# Altium footprint library smd-ipc.PCBLIB: 363 footprints (part 7 of 27)
Each footprint in its own frame and in the unit in brackets; x right, y up, seen from the top. Pads: shape width x height; smd on the part's side, far side on the other; paste and mask are expansions set on the pad; w line width, h text height; cw(c..) or ccw(c..) is an arc to the next point about the centre after c.
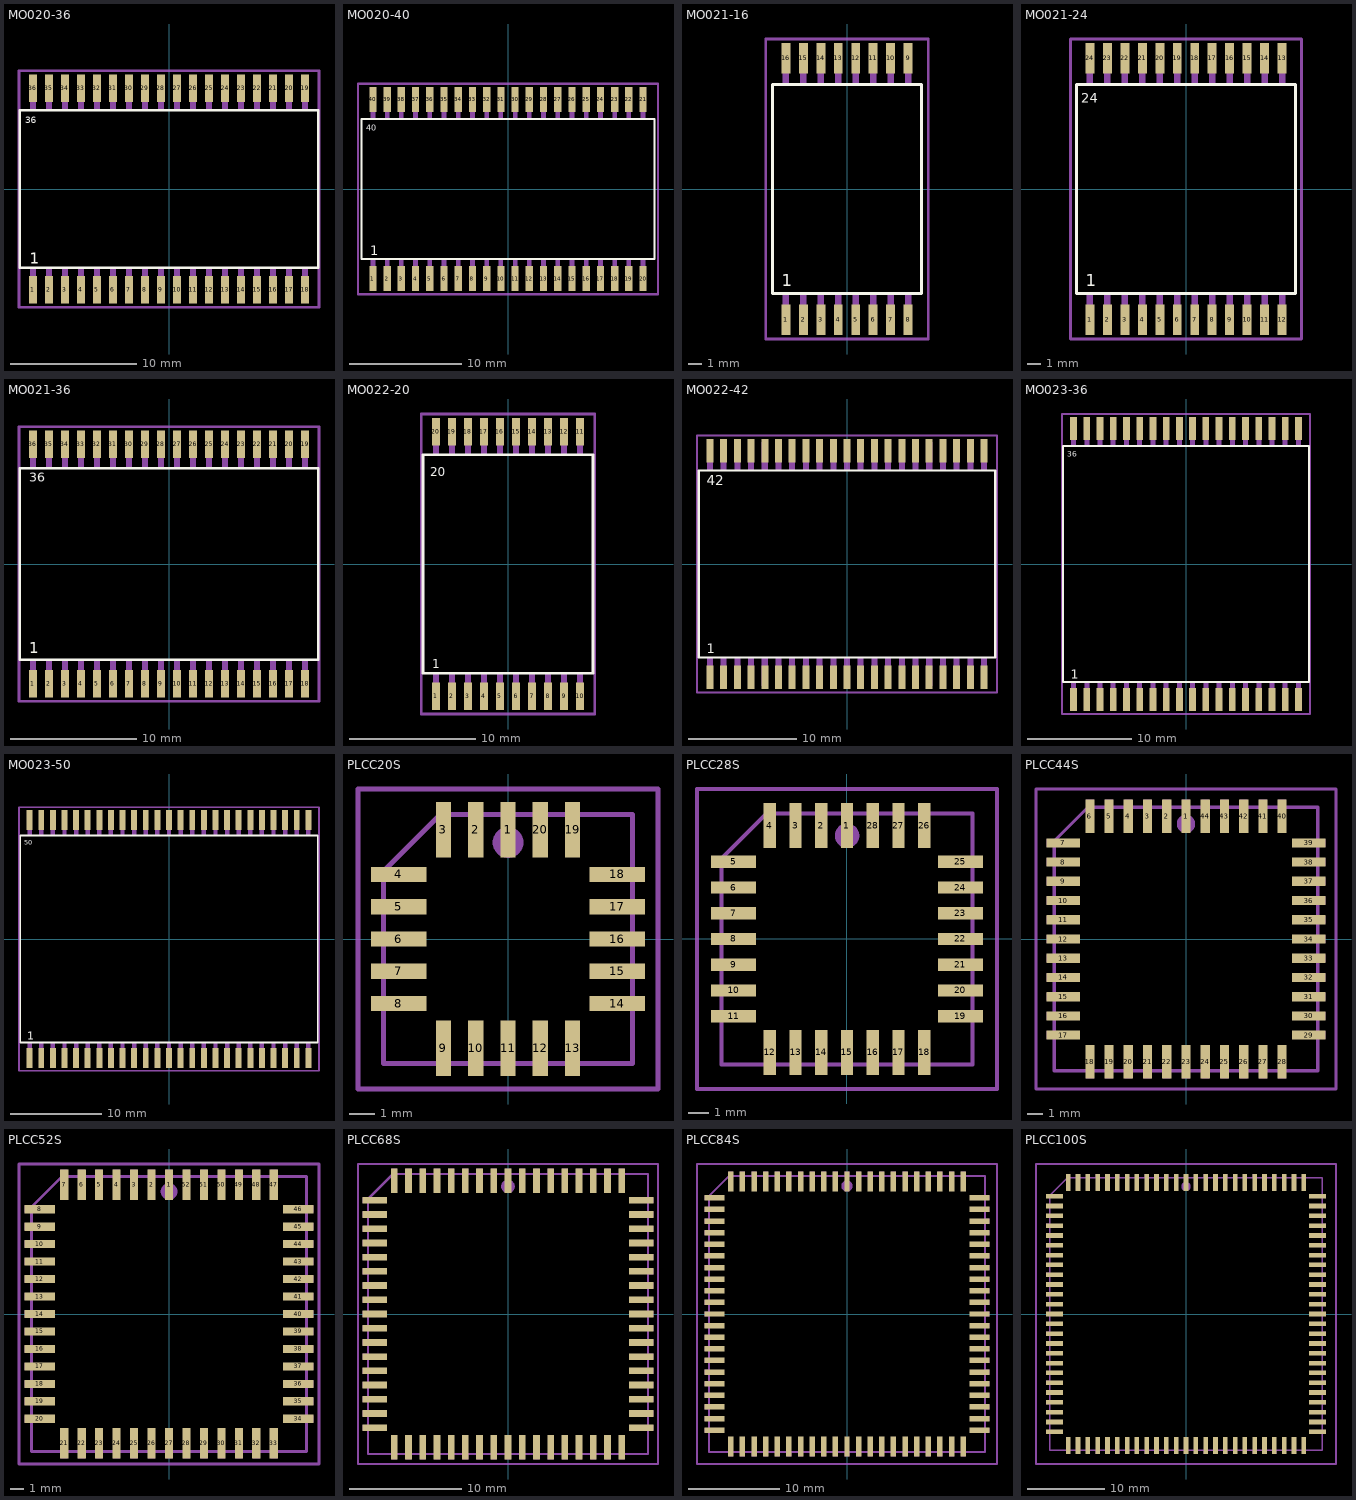
[diagram p6: the footprints below, top view; thin cyan lines are the x and y axes]

## MO020-36 [mm]
pads (36):
  rect 0.65x2.2 smd: 1(-10.795,-8) 2(-9.525,-8) 3(-8.255,-8) 4(-6.985,-8) 5(-5.715,-8) 6(-4.445,-8) 7(-3.175,-8) 8(-1.905,-8) 9(-0.635,-8) 10(0.635,-8) 11(1.905,-8) 12(3.175,-8) 13(4.445,-8) 14(5.715,-8) 15(6.985,-8) 16(8.255,-8) 17(9.525,-8) 18(10.795,-8) 19(10.795,8) 20(9.525,8) 21(8.255,8) 22(6.985,8) 23(5.715,8) 24(4.445,8) 25(3.175,8) 26(1.905,8) 27(0.635,8) 28(-0.635,8) 29(-1.905,8) 30(-3.175,8) 31(-4.445,8) 32(-5.715,8) 33(-6.985,8) 34(-8.255,8) 35(-9.525,8) 36(-10.795,8)
Top Overlay:
  lines w0.203: -11.825,-6.25 11.825,-6.25 11.825,6.25 -11.825,6.25 -11.825,-6.25
  text "1" at -11.046,-5.935 h0.86
  text "36" at -11.386,5.2 h0.52
Mechanical 16:
  rectangle: -11.035,-8.8 -10.555,-6.25
  rectangle: -9.765,-8.8 -9.285,-6.25
  rectangle: -8.495,-8.8 -8.015,-6.25
  rectangle: -7.225,-8.8 -6.745,-6.25
  rectangle: -5.955,-8.8 -5.475,-6.25
  rectangle: -4.685,-8.8 -4.205,-6.25
  rectangle: -3.415,-8.8 -2.935,-6.25
  rectangle: -2.145,-8.8 -1.665,-6.25
  rectangle: -0.875,-8.8 -0.395,-6.25
  rectangle: 0.395,-8.8 0.875,-6.25
  rectangle: 1.665,-8.8 2.145,-6.25
  rectangle: 2.935,-8.8 3.415,-6.25
  rectangle: 4.205,-8.8 4.685,-6.25
  rectangle: 5.475,-8.8 5.955,-6.25
  rectangle: 6.745,-8.8 7.225,-6.25
  rectangle: 8.015,-8.8 8.495,-6.25
  rectangle: 9.285,-8.8 9.765,-6.25
  rectangle: 10.555,-8.8 11.035,-6.25
  rectangle: 10.555,6.25 11.035,8.8
  rectangle: 9.285,6.25 9.765,8.8
  rectangle: 8.015,6.25 8.495,8.8
  rectangle: 6.745,6.25 7.225,8.8
  rectangle: 5.475,6.25 5.955,8.8
  rectangle: 4.205,6.25 4.685,8.8
  rectangle: 2.935,6.25 3.415,8.8
  rectangle: 1.665,6.25 2.145,8.8
  rectangle: 0.395,6.25 0.875,8.8
  rectangle: -0.875,6.25 -0.395,8.8
  rectangle: -2.145,6.25 -1.665,8.8
  rectangle: -3.415,6.25 -2.935,8.8
  rectangle: -4.685,6.25 -4.205,8.8
  rectangle: -5.955,6.25 -5.475,8.8
  rectangle: -7.225,6.25 -6.745,8.8
  rectangle: -8.495,6.25 -8.015,8.8
  rectangle: -9.765,6.25 -9.285,8.8
  rectangle: -11.035,6.25 -10.555,8.8
Mechanical 27:
  lines w0.2: -11.9,-9.4 -11.9,9.4 11.9,9.4 11.9,-9.4 -11.9,-9.4

## MO020-40 [mm]
pads (40):
  rect 0.65x2.2 smd: 1(-12.065,-8) 2(-10.795,-8) 3(-9.525,-8) 4(-8.255,-8) 5(-6.985,-8) 6(-5.715,-8) 7(-4.445,-8) 8(-3.175,-8) 9(-1.905,-8) 10(-0.635,-8) 11(0.635,-8) 12(1.905,-8) 13(3.175,-8) 14(4.445,-8) 15(5.715,-8) 16(6.985,-8) 17(8.255,-8) 18(9.525,-8) 19(10.795,-8) 20(12.065,-8) 21(12.065,8) 22(10.795,8) 23(9.525,8) 24(8.255,8) 25(6.985,8) 26(5.715,8) 27(4.445,8) 28(3.175,8) 29(1.905,8) 30(0.635,8) 31(-0.635,8) 32(-1.905,8) 33(-3.175,8) 34(-4.445,8) 35(-5.715,8) 36(-6.985,8) 37(-8.255,8) 38(-9.525,8) 39(-10.795,8) 40(-12.065,8)
Top Overlay:
  lines w0.203: -13.095,-6.25 13.095,-6.25 13.095,6.25 -13.095,6.25 -13.095,-6.25
  text "1" at -12.316,-5.935 h0.86
  text "40" at -12.656,5.2 h0.52
Mechanical 16:
  rectangle: -12.275,-8.8 -11.855,-6.25
  rectangle: -11.005,-8.8 -10.585,-6.25
  rectangle: -9.735,-8.8 -9.315,-6.25
  rectangle: -8.465,-8.8 -8.045,-6.25
  rectangle: -7.195,-8.8 -6.775,-6.25
  rectangle: -5.925,-8.8 -5.505,-6.25
  rectangle: -4.655,-8.8 -4.235,-6.25
  rectangle: -3.385,-8.8 -2.965,-6.25
  rectangle: -2.115,-8.8 -1.695,-6.25
  rectangle: -0.845,-8.8 -0.425,-6.25
  rectangle: 0.425,-8.8 0.845,-6.25
  rectangle: 1.695,-8.8 2.115,-6.25
  rectangle: 2.965,-8.8 3.385,-6.25
  rectangle: 4.235,-8.8 4.655,-6.25
  rectangle: 5.505,-8.8 5.925,-6.25
  rectangle: 6.775,-8.8 7.195,-6.25
  rectangle: 8.045,-8.8 8.465,-6.25
  rectangle: 9.315,-8.8 9.735,-6.25
  rectangle: 10.585,-8.8 11.005,-6.25
  rectangle: 11.855,-8.8 12.275,-6.25
  rectangle: 11.855,6.25 12.275,8.8
  rectangle: 10.585,6.25 11.005,8.8
  rectangle: 9.315,6.25 9.735,8.8
  rectangle: 8.045,6.25 8.465,8.8
  rectangle: 6.775,6.25 7.195,8.8
  rectangle: 5.505,6.25 5.925,8.8
  rectangle: 4.235,6.25 4.655,8.8
  rectangle: 2.965,6.25 3.385,8.8
  rectangle: 1.695,6.25 2.115,8.8
  rectangle: 0.425,6.25 0.845,8.8
  rectangle: -0.845,6.25 -0.425,8.8
  rectangle: -2.115,6.25 -1.695,8.8
  rectangle: -3.385,6.25 -2.965,8.8
  rectangle: -4.655,6.25 -4.235,8.8
  rectangle: -5.925,6.25 -5.505,8.8
  rectangle: -7.195,6.25 -6.775,8.8
  rectangle: -8.465,6.25 -8.045,8.8
  rectangle: -9.735,6.25 -9.315,8.8
  rectangle: -11.005,6.25 -10.585,8.8
  rectangle: -12.275,6.25 -11.855,8.8
Mechanical 27:
  lines w0.2: -13.4,-9.4 -13.4,9.4 13.4,9.4 13.4,-9.4 -13.4,-9.4

## MO021-16 [mm]
pads (16):
  rect 0.65x2.2 smd: 1(-4.445,-9.5) 2(-3.175,-9.5) 3(-1.905,-9.5) 4(-0.635,-9.5) 5(0.635,-9.5) 6(1.905,-9.5) 7(3.175,-9.5) 8(4.445,-9.5) 9(4.445,9.5) 10(3.175,9.5) 11(1.905,9.5) 12(0.635,9.5) 13(-0.635,9.5) 14(-1.905,9.5) 15(-3.175,9.5) 16(-4.445,9.5)
Top Overlay:
  lines w0.203: -5.41,-7.585 5.41,-7.585 5.41,7.585 -5.41,7.585 -5.41,-7.585
  text "1" at -4.756,-7.07 h0.86
Mechanical 16:
  rectangle: -4.685,-10.3 -4.205,-7.6
  rectangle: -3.415,-10.3 -2.935,-7.6
  rectangle: -2.145,-10.3 -1.665,-7.6
  rectangle: -0.875,-10.3 -0.395,-7.6
  rectangle: 0.395,-10.3 0.875,-7.6
  rectangle: 1.665,-10.3 2.145,-7.6
  rectangle: 2.935,-10.3 3.415,-7.6
  rectangle: 4.205,-10.3 4.685,-7.6
  rectangle: 4.205,7.6 4.685,10.3
  rectangle: 2.935,7.6 3.415,10.3
  rectangle: 1.665,7.6 2.145,10.3
  rectangle: 0.395,7.6 0.875,10.3
  rectangle: -0.875,7.6 -0.395,10.3
  rectangle: -2.145,7.6 -1.665,10.3
  rectangle: -3.415,7.6 -2.935,10.3
  rectangle: -4.685,7.6 -4.205,10.3
Mechanical 27:
  lines w0.2: -5.9,-10.9 -5.9,10.9 5.9,10.9 5.9,-10.9 -5.9,-10.9

## MO021-24 [mm]
pads (24):
  rect 0.65x2.2 smd: 1(-6.985,-9.5) 2(-5.715,-9.5) 3(-4.445,-9.5) 4(-3.175,-9.5) 5(-1.905,-9.5) 6(-0.635,-9.5) 7(0.635,-9.5) 8(1.905,-9.5) 9(3.175,-9.5) 10(4.445,-9.5) 11(5.715,-9.5) 12(6.985,-9.5) 13(6.985,9.5) 14(5.715,9.5) 15(4.445,9.5) 16(3.175,9.5) 17(1.905,9.5) 18(0.635,9.5) 19(-0.635,9.5) 20(-1.905,9.5) 21(-3.175,9.5) 22(-4.445,9.5) 23(-5.715,9.5) 24(-6.985,9.5)
Top Overlay:
  lines w0.203: -7.95,-7.585 7.95,-7.585 7.95,7.585 -7.95,7.585 -7.95,-7.585
  text "1" at -7.296,-7.07 h0.86
  text "24" at -7.606,6.265 h0.69
Mechanical 16:
  rectangle: -7.225,-10.3 -6.745,-7.6
  rectangle: -5.955,-10.3 -5.475,-7.6
  rectangle: -4.685,-10.3 -4.205,-7.6
  rectangle: -3.415,-10.3 -2.935,-7.6
  rectangle: -2.145,-10.3 -1.665,-7.6
  rectangle: -0.875,-10.3 -0.395,-7.6
  rectangle: 0.395,-10.3 0.875,-7.6
  rectangle: 1.665,-10.3 2.145,-7.6
  rectangle: 2.935,-10.3 3.415,-7.6
  rectangle: 4.205,-10.3 4.685,-7.6
  rectangle: 5.475,-10.3 5.955,-7.6
  rectangle: 6.745,-10.3 7.225,-7.6
  rectangle: 6.745,7.6 7.225,10.3
  rectangle: 5.475,7.6 5.955,10.3
  rectangle: 4.205,7.6 4.685,10.3
  rectangle: 2.935,7.6 3.415,10.3
  rectangle: 1.665,7.6 2.145,10.3
  rectangle: 0.395,7.6 0.875,10.3
  rectangle: -0.875,7.6 -0.395,10.3
  rectangle: -2.145,7.6 -1.665,10.3
  rectangle: -3.415,7.6 -2.935,10.3
  rectangle: -4.685,7.6 -4.205,10.3
  rectangle: -5.955,7.6 -5.475,10.3
  rectangle: -7.225,7.6 -6.745,10.3
Mechanical 27:
  lines w0.2: -8.4,-10.9 -8.4,10.9 8.4,10.9 8.4,-10.9 -8.4,-10.9

## MO021-36 [mm]
pads (36):
  rect 0.65x2.2 smd: 1(-10.795,-9.5) 2(-9.525,-9.5) 3(-8.255,-9.5) 4(-6.985,-9.5) 5(-5.715,-9.5) 6(-4.445,-9.5) 7(-3.175,-9.5) 8(-1.905,-9.5) 9(-0.635,-9.5) 10(0.635,-9.5) 11(1.905,-9.5) 12(3.175,-9.5) 13(4.445,-9.5) 14(5.715,-9.5) 15(6.985,-9.5) 16(8.255,-9.5) 17(9.525,-9.5) 18(10.795,-9.5) 19(10.795,9.5) 20(9.525,9.5) 21(8.255,9.5) 22(6.985,9.5) 23(5.715,9.5) 24(4.445,9.5) 25(3.175,9.5) 26(1.905,9.5) 27(0.635,9.5) 28(-0.635,9.5) 29(-1.905,9.5) 30(-3.175,9.5) 31(-4.445,9.5) 32(-5.715,9.5) 33(-6.985,9.5) 34(-8.255,9.5) 35(-9.525,9.5) 36(-10.795,9.5)
Top Overlay:
  lines w0.203: -11.833,-7.585 11.833,-7.585 11.833,7.585 -11.833,7.585 -11.833,-7.585
  text "1" at -11.106,-7.07 h0.86
  text "36" at -11.106,6.265 h1.26
Mechanical 16:
  rectangle: -11.035,-10.3 -10.555,-7.6
  rectangle: -9.765,-10.3 -9.285,-7.6
  rectangle: -8.495,-10.3 -8.015,-7.6
  rectangle: -7.225,-10.3 -6.745,-7.6
  rectangle: -5.955,-10.3 -5.475,-7.6
  rectangle: -4.685,-10.3 -4.205,-7.6
  rectangle: -3.415,-10.3 -2.935,-7.6
  rectangle: -2.145,-10.3 -1.665,-7.6
  rectangle: -0.875,-10.3 -0.395,-7.6
  rectangle: 0.395,-10.3 0.875,-7.6
  rectangle: 1.665,-10.3 2.145,-7.6
  rectangle: 2.935,-10.3 3.415,-7.6
  rectangle: 4.205,-10.3 4.685,-7.6
  rectangle: 5.475,-10.3 5.955,-7.6
  rectangle: 6.745,-10.3 7.225,-7.6
  rectangle: 8.015,-10.3 8.495,-7.6
  rectangle: 9.285,-10.3 9.765,-7.6
  rectangle: 10.555,-10.3 11.035,-7.6
  rectangle: 10.555,7.6 11.035,10.3
  rectangle: 9.285,7.6 9.765,10.3
  rectangle: 8.015,7.6 8.495,10.3
  rectangle: 6.745,7.6 7.225,10.3
  rectangle: 5.475,7.6 5.955,10.3
  rectangle: 4.205,7.6 4.685,10.3
  rectangle: 2.935,7.6 3.415,10.3
  rectangle: 1.665,7.6 2.145,10.3
  rectangle: 0.395,7.6 0.875,10.3
  rectangle: -0.875,7.6 -0.395,10.3
  rectangle: -2.145,7.6 -1.665,10.3
  rectangle: -3.415,7.6 -2.935,10.3
  rectangle: -4.685,7.6 -4.205,10.3
  rectangle: -5.955,7.6 -5.475,10.3
  rectangle: -7.225,7.6 -6.745,10.3
  rectangle: -8.495,7.6 -8.015,10.3
  rectangle: -9.765,7.6 -9.285,10.3
  rectangle: -11.035,7.6 -10.555,10.3
Mechanical 27:
  lines w0.2: -11.9,-10.9 -11.9,10.9 11.9,10.9 11.9,-10.9 -11.9,-10.9

## MO022-20 [mm]
pads (20):
  rect 0.65x2.2 smd: 1(-5.715,-10.5) 2(-4.445,-10.5) 3(-3.175,-10.5) 4(-1.905,-10.5) 5(-0.635,-10.5) 6(0.635,-10.5) 7(1.905,-10.5) 8(3.175,-10.5) 9(4.445,-10.5) 10(5.715,-10.5) 11(5.715,10.5) 12(4.445,10.5) 13(3.175,10.5) 14(1.905,10.5) 15(0.635,10.5) 16(-0.635,10.5) 17(-1.905,10.5) 18(-3.175,10.5) 19(-4.445,10.5) 20(-5.715,10.5)
Top Overlay:
  lines w0.203: -6.745,-8.655 6.745,-8.655 6.745,8.655 -6.745,8.655 -6.745,-8.655
  text "1" at -6.026,-8.285 h0.69
  text "20" at -6.161,6.955 h0.69
Mechanical 16:
  rectangle: -5.955,-11.3 -5.475,-8.6
  rectangle: -4.685,-11.3 -4.205,-8.6
  rectangle: -3.415,-11.3 -2.935,-8.6
  rectangle: -2.145,-11.3 -1.665,-8.6
  rectangle: -0.875,-11.3 -0.395,-8.6
  rectangle: 0.395,-11.3 0.875,-8.6
  rectangle: 1.665,-11.3 2.145,-8.6
  rectangle: 2.935,-11.3 3.415,-8.6
  rectangle: 4.205,-11.3 4.685,-8.6
  rectangle: 5.475,-11.3 5.955,-8.6
  rectangle: 5.475,8.6 5.955,11.3
  rectangle: 4.205,8.6 4.685,11.3
  rectangle: 2.935,8.6 3.415,11.3
  rectangle: 1.665,8.6 2.145,11.3
  rectangle: 0.395,8.6 0.875,11.3
  rectangle: -0.875,8.6 -0.395,11.3
  rectangle: -2.145,8.6 -1.665,11.3
  rectangle: -3.415,8.6 -2.935,11.3
  rectangle: -4.685,8.6 -4.205,11.3
  rectangle: -5.955,8.6 -5.475,11.3
Mechanical 27:
  lines w0.2: -6.9,-11.9 -6.9,11.9 6.9,11.9 6.9,-11.9 -6.9,-11.9

## MO022-42 [mm]
pads (42):
  rect 0.65x2.2 smd: 1(-12.7,-10.5) 2(-11.43,-10.5) 3(-10.16,-10.5) 4(-8.89,-10.5) 5(-7.62,-10.5) 6(-6.35,-10.5) 7(-5.08,-10.5) 8(-3.81,-10.5) 9(-2.54,-10.5) 10(-1.27,-10.5) 11(0,-10.5) 12(1.27,-10.5) 13(2.54,-10.5) 14(3.81,-10.5) 15(5.08,-10.5) 16(6.35,-10.5) 17(7.62,-10.5) 18(8.89,-10.5) 19(10.16,-10.5) 20(11.43,-10.5) 21(12.7,-10.5) 22(12.7,10.5) 23(11.43,10.5) 24(10.16,10.5) 25(8.89,10.5) 26(7.62,10.5) 27(6.35,10.5) 28(5.08,10.5) 29(3.81,10.5) 30(2.54,10.5) 31(1.27,10.5) 32(0,10.5) 33(-1.27,10.5) 34(-2.54,10.5) 35(-3.81,10.5) 36(-5.08,10.5) 37(-6.35,10.5) 38(-7.62,10.5) 39(-8.89,10.5) 40(-10.16,10.5) 41(-11.43,10.5) 42(-12.7,10.5)
Top Overlay:
  lines w0.203: -13.73,-8.655 13.73,-8.655 13.73,8.655 -13.73,8.655 -13.73,-8.655
  text "1" at -13.011,-8.285 h0.86
  text "42" at -13.011,6.955 h1.57
Mechanical 16:
  rectangle: -12.98,-11.3 -12.42,-8.6
  rectangle: -11.71,-11.3 -11.15,-8.6
  rectangle: -10.44,-11.3 -9.88,-8.6
  rectangle: -9.17,-11.3 -8.61,-8.6
  rectangle: -7.9,-11.3 -7.34,-8.6
  rectangle: -6.63,-11.3 -6.07,-8.6
  rectangle: -5.36,-11.3 -4.8,-8.6
  rectangle: -4.09,-11.3 -3.53,-8.6
  rectangle: -2.82,-11.3 -2.26,-8.6
  rectangle: -1.55,-11.3 -0.99,-8.6
  rectangle: -0.28,-11.3 0.28,-8.6
  rectangle: 0.99,-11.3 1.55,-8.6
  rectangle: 2.26,-11.3 2.82,-8.6
  rectangle: 3.53,-11.3 4.09,-8.6
  rectangle: 4.8,-11.3 5.36,-8.6
  rectangle: 6.07,-11.3 6.63,-8.6
  rectangle: 7.34,-11.3 7.9,-8.6
  rectangle: 8.61,-11.3 9.17,-8.6
  rectangle: 9.88,-11.3 10.44,-8.6
  rectangle: 11.15,-11.3 11.71,-8.6
  rectangle: 12.42,-11.3 12.98,-8.6
  rectangle: 12.42,8.6 12.98,11.3
  rectangle: 11.15,8.6 11.71,11.3
  rectangle: 9.88,8.6 10.44,11.3
  rectangle: 8.61,8.6 9.17,11.3
  rectangle: 7.34,8.6 7.9,11.3
  rectangle: 6.07,8.6 6.63,11.3
  rectangle: 4.8,8.6 5.36,11.3
  rectangle: 3.53,8.6 4.09,11.3
  rectangle: 2.26,8.6 2.82,11.3
  rectangle: 0.99,8.6 1.55,11.3
  rectangle: -0.28,8.6 0.28,11.3
  rectangle: -1.55,8.6 -0.99,11.3
  rectangle: -2.82,8.6 -2.26,11.3
  rectangle: -4.09,8.6 -3.53,11.3
  rectangle: -5.36,8.6 -4.8,11.3
  rectangle: -6.63,8.6 -6.07,11.3
  rectangle: -7.9,8.6 -7.34,11.3
  rectangle: -9.17,8.6 -8.61,11.3
  rectangle: -10.44,8.6 -9.88,11.3
  rectangle: -11.71,8.6 -11.15,11.3
  rectangle: -12.98,8.6 -12.42,11.3
Mechanical 27:
  lines w0.2: -13.9,-11.9 -13.9,11.9 13.9,11.9 13.9,-11.9 -13.9,-11.9

## MO023-36 [mm]
pads (36):
  rect 0.65x2.2 smd: 1(-10.795,-13) 2(-9.525,-13) 3(-8.255,-13) 4(-6.985,-13) 5(-5.715,-13) 6(-4.445,-13) 7(-3.175,-13) 8(-1.905,-13) 9(-0.635,-13) 10(0.635,-13) 11(1.905,-13) 12(3.175,-13) 13(4.445,-13) 14(5.715,-13) 15(6.985,-13) 16(8.255,-13) 17(9.525,-13) 18(10.795,-13) 19(10.795,13) 20(9.525,13) 21(8.255,13) 22(6.985,13) 23(5.715,13) 24(4.445,13) 25(3.175,13) 26(1.905,13) 27(0.635,13) 28(-0.635,13) 29(-1.905,13) 30(-3.175,13) 31(-4.445,13) 32(-5.715,13) 33(-6.985,13) 34(-8.255,13) 35(-9.525,13) 36(-10.795,13)
Top Overlay:
  lines w0.203: -11.825,-11.33 11.825,-11.33 11.825,11.33 -11.825,11.33 -11.825,-11.33
  text "1" at -11.046,-11.015 h0.86
  text "36" at -11.386,10.28 h0.52
Mechanical 16:
  rectangle: -11.035,-13.8 -10.555,-11.25
  rectangle: -9.765,-13.8 -9.285,-11.25
  rectangle: -8.495,-13.8 -8.015,-11.25
  rectangle: -7.225,-13.8 -6.745,-11.25
  rectangle: -5.955,-13.8 -5.475,-11.25
  rectangle: -4.685,-13.8 -4.205,-11.25
  rectangle: -3.415,-13.8 -2.935,-11.25
  rectangle: -2.145,-13.8 -1.665,-11.25
  rectangle: -0.875,-13.8 -0.395,-11.25
  rectangle: 0.395,-13.8 0.875,-11.25
  rectangle: 1.665,-13.8 2.145,-11.25
  rectangle: 2.935,-13.8 3.415,-11.25
  rectangle: 4.205,-13.8 4.685,-11.25
  rectangle: 5.475,-13.8 5.955,-11.25
  rectangle: 6.745,-13.8 7.225,-11.25
  rectangle: 8.015,-13.8 8.495,-11.25
  rectangle: 9.285,-13.8 9.765,-11.25
  rectangle: 10.555,-13.8 11.035,-11.25
  rectangle: 10.555,11.25 11.035,13.8
  rectangle: 9.285,11.25 9.765,13.8
  rectangle: 8.015,11.25 8.495,13.8
  rectangle: 6.745,11.25 7.225,13.8
  rectangle: 5.475,11.25 5.955,13.8
  rectangle: 4.205,11.25 4.685,13.8
  rectangle: 2.935,11.25 3.415,13.8
  rectangle: 1.665,11.25 2.145,13.8
  rectangle: 0.395,11.25 0.875,13.8
  rectangle: -0.875,11.25 -0.395,13.8
  rectangle: -2.145,11.25 -1.665,13.8
  rectangle: -3.415,11.25 -2.935,13.8
  rectangle: -4.685,11.25 -4.205,13.8
  rectangle: -5.955,11.25 -5.475,13.8
  rectangle: -7.225,11.25 -6.745,13.8
  rectangle: -8.495,11.25 -8.015,13.8
  rectangle: -9.765,11.25 -9.285,13.8
  rectangle: -11.035,11.25 -10.555,13.8
Mechanical 27:
  lines w0.2: -11.9,-14.4 -11.9,14.4 11.9,14.4 11.9,-14.4 -11.9,-14.4

## MO023-50 [mm]
pads (50):
  rect 0.65x2.2 smd: 1(-15.24,-13) 2(-13.97,-13) 3(-12.7,-13) 4(-11.43,-13) 5(-10.16,-13) 6(-8.89,-13) 7(-7.62,-13) 8(-6.35,-13) 9(-5.08,-13) 10(-3.81,-13) 11(-2.54,-13) 12(-1.27,-13) 13(0,-13) 14(1.27,-13) 15(2.54,-13) 16(3.81,-13) 17(5.08,-13) 18(6.35,-13) 19(7.62,-13) 20(8.89,-13) 21(10.16,-13) 22(11.43,-13) 23(12.7,-13) 24(13.97,-13) 25(15.24,-13) 26(15.24,13) 27(13.97,13) 28(12.7,13) 29(11.43,13) 30(10.16,13) 31(8.89,13) 32(7.62,13) 33(6.35,13) 34(5.08,13) 35(3.81,13) 36(2.54,13) 37(1.27,13) 38(0,13) 39(-1.27,13) 40(-2.54,13) 41(-3.81,13) 42(-5.08,13) 43(-6.35,13) 44(-7.62,13) 45(-8.89,13) 46(-10.16,13) 47(-11.43,13) 48(-12.7,13) 49(-13.97,13) 50(-15.24,13)
Top Overlay:
  lines w0.203: -16.27,-11.33 16.27,-11.33 16.27,11.33 -16.27,11.33 -16.27,-11.33
  text "1" at -15.491,-11.015 h0.86
  text "50" at -15.831,10.28 h0.52
Mechanical 16:
  rectangle: -15.48,-13.8 -15,-11.25
  rectangle: -14.21,-13.8 -13.73,-11.25
  rectangle: -12.94,-13.8 -12.46,-11.25
  rectangle: -11.67,-13.8 -11.19,-11.25
  rectangle: -10.4,-13.8 -9.92,-11.25
  rectangle: -9.13,-13.8 -8.65,-11.25
  rectangle: -7.86,-13.8 -7.38,-11.25
  rectangle: -6.59,-13.8 -6.11,-11.25
  rectangle: -5.32,-13.8 -4.84,-11.25
  rectangle: -4.05,-13.8 -3.57,-11.25
  rectangle: -2.78,-13.8 -2.3,-11.25
  rectangle: -1.51,-13.8 -1.03,-11.25
  rectangle: -0.24,-13.8 0.24,-11.25
  rectangle: 1.03,-13.8 1.51,-11.25
  rectangle: 2.3,-13.8 2.78,-11.25
  rectangle: 3.57,-13.8 4.05,-11.25
  rectangle: 4.84,-13.8 5.32,-11.25
  rectangle: 6.11,-13.8 6.59,-11.25
  rectangle: 7.38,-13.8 7.86,-11.25
  rectangle: 8.65,-13.8 9.13,-11.25
  rectangle: 9.92,-13.8 10.4,-11.25
  rectangle: 11.19,-13.8 11.67,-11.25
  rectangle: 12.46,-13.8 12.94,-11.25
  rectangle: 13.73,-13.8 14.21,-11.25
  rectangle: 15,-13.8 15.48,-11.25
  rectangle: 15,11.25 15.48,13.8
  rectangle: 13.73,11.25 14.21,13.8
  rectangle: 12.46,11.25 12.94,13.8
  rectangle: 11.19,11.25 11.67,13.8
  rectangle: 9.92,11.25 10.4,13.8
  rectangle: 8.65,11.25 9.13,13.8
  rectangle: 7.38,11.25 7.86,13.8
  rectangle: 6.11,11.25 6.59,13.8
  rectangle: 4.84,11.25 5.32,13.8
  rectangle: 3.57,11.25 4.05,13.8
  rectangle: 2.3,11.25 2.78,13.8
  rectangle: 1.03,11.25 1.51,13.8
  rectangle: -0.24,11.25 0.24,13.8
  rectangle: -1.51,11.25 -1.03,13.8
  rectangle: -2.78,11.25 -2.3,13.8
  rectangle: -4.05,11.25 -3.57,13.8
  rectangle: -5.32,11.25 -4.84,13.8
  rectangle: -6.59,11.25 -6.11,13.8
  rectangle: -7.86,11.25 -7.38,13.8
  rectangle: -9.13,11.25 -8.65,13.8
  rectangle: -10.4,11.25 -9.92,13.8
  rectangle: -11.67,11.25 -11.19,13.8
  rectangle: -12.94,11.25 -12.46,13.8
  rectangle: -14.21,11.25 -13.73,13.8
  rectangle: -15.48,11.25 -15,13.8
Mechanical 27:
  lines w0.2: -16.4,-14.4 -16.4,14.4 16.4,14.4 16.4,-14.4 -16.4,-14.4

## PLCC20S [mm]
pads (20):
  rect 0.6x2.2 smd: 1(0,4.3) 2(-1.27,4.3) 3(-2.54,4.3) 9(-2.54,-4.3) 10(-1.27,-4.3) 11(0,-4.3) 12(1.27,-4.3) 13(2.54,-4.3) 19(2.54,4.3) 20(1.27,4.3)
  rect 2.2x0.6 smd: 4(-4.3,2.54) 5(-4.3,1.27) 6(-4.3,0) 7(-4.3,-1.27) 8(-4.3,-2.54) 14(4.3,-2.54) 15(4.3,-1.27) 16(4.3,0) 17(4.3,1.27) 18(4.3,2.54)
Mechanical 16:
  circle w0.61: c0,3.8 r0.3
  rectangle: -0.26,4.95 0.26,5.4
  rectangle: -1.53,4.95 -1.01,5.4
  rectangle: -2.8,4.95 -2.28,5.4
  rectangle: -5.4,2.28 -4.95,2.8
  rectangle: -5.4,1.01 -4.95,1.53
  rectangle: -5.4,-0.26 -4.95,0.26
  rectangle: -5.4,-1.53 -4.95,-1.01
  rectangle: -5.4,-2.8 -4.95,-2.28
  rectangle: -2.8,-5.4 -2.28,-4.95
  rectangle: -1.53,-5.4 -1.01,-4.95
  rectangle: -0.26,-5.4 0.26,-4.95
  rectangle: 1.01,-5.4 1.53,-4.95
  rectangle: 2.28,-5.4 2.8,-4.95
  rectangle: 4.95,-2.8 5.4,-2.28
  rectangle: 4.95,-1.53 5.4,-1.01
  rectangle: 4.95,-0.26 5.4,0.26
  rectangle: 4.95,1.01 5.4,1.53
  rectangle: 4.95,2.28 5.4,2.8
  rectangle: 2.28,4.95 2.8,5.4
  rectangle: 1.01,4.95 1.53,5.4
  lines w0.203: -4.9,-4.9 -4.9,2.665 -2.665,4.9 4.9,4.9 4.9,-4.9 -4.9,-4.9
Mechanical 27:
  lines w0.2: -5.903,-5.903 5.903,-5.903 5.903,5.903 -5.903,5.903 -5.903,-5.903

## PLCC28S [mm]
pads (28):
  rect 0.6x2.2 smd: 1(0,5.6) 2(-1.27,5.6) 3(-2.54,5.6) 4(-3.81,5.6) 12(-3.81,-5.6) 13(-2.54,-5.6) 14(-1.27,-5.6) 15(0,-5.6) 16(1.27,-5.6) 17(2.54,-5.6) 18(3.81,-5.6) 26(3.81,5.6) 27(2.54,5.6) 28(1.27,5.6)
  rect 2.2x0.6 smd: 5(-5.6,3.81) 6(-5.6,2.54) 7(-5.6,1.27) 8(-5.6,0) 9(-5.6,-1.27) 10(-5.6,-2.54) 11(-5.6,-3.81) 19(5.6,-3.81) 20(5.6,-2.54) 21(5.6,-1.27) 22(5.6,0) 23(5.6,1.27) 24(5.6,2.54) 25(5.6,3.81)
Mechanical 16:
  circle w0.61: c0,5.1 r0.3
  rectangle: -0.26,6.25 0.26,6.7
  rectangle: -1.53,6.25 -1.01,6.7
  rectangle: -2.8,6.25 -2.28,6.7
  rectangle: -4.07,6.25 -3.55,6.7
  rectangle: -6.7,3.55 -6.25,4.07
  rectangle: -6.7,2.28 -6.25,2.8
  rectangle: -6.7,1.01 -6.25,1.53
  rectangle: -6.7,-0.26 -6.25,0.26
  rectangle: -6.7,-1.53 -6.25,-1.01
  rectangle: -6.7,-2.8 -6.25,-2.28
  rectangle: -6.7,-4.07 -6.25,-3.55
  rectangle: -4.07,-6.7 -3.55,-6.25
  rectangle: -2.8,-6.7 -2.28,-6.25
  rectangle: -1.53,-6.7 -1.01,-6.25
  rectangle: -0.26,-6.7 0.26,-6.25
  rectangle: 1.01,-6.7 1.53,-6.25
  rectangle: 2.28,-6.7 2.8,-6.25
  rectangle: 3.55,-6.7 4.07,-6.25
  rectangle: 6.25,-4.07 6.7,-3.55
  rectangle: 6.25,-2.8 6.7,-2.28
  rectangle: 6.25,-1.53 6.7,-1.01
  rectangle: 6.25,-0.26 6.7,0.26
  rectangle: 6.25,1.01 6.7,1.53
  rectangle: 6.25,2.28 6.7,2.8
  rectangle: 6.25,3.55 6.7,4.07
  rectangle: 3.55,6.25 4.07,6.7
  rectangle: 2.28,6.25 2.8,6.7
  rectangle: 1.01,6.25 1.53,6.7
  lines w0.203: -6.2,-6.2 -6.2,3.965 -3.965,6.2 6.2,6.2 6.2,-6.2 -6.2,-6.2
Mechanical 27:
  lines w0.2: -7.403,-7.403 7.403,-7.403 7.403,7.403 -7.403,7.403 -7.403,-7.403

## PLCC44S [mm]
pads (44):
  rect 0.6x2.2 smd: 1(0,8.1) 2(-1.27,8.1) 3(-2.54,8.1) 4(-3.81,8.1) 5(-5.08,8.1) 6(-6.35,8.1) 18(-6.35,-8.1) 19(-5.08,-8.1) 20(-3.81,-8.1) 21(-2.54,-8.1) 22(-1.27,-8.1) 23(0,-8.1) 24(1.27,-8.1) 25(2.54,-8.1) 26(3.81,-8.1) 27(5.08,-8.1) 28(6.35,-8.1) 40(6.35,8.1) 41(5.08,8.1) 42(3.81,8.1) 43(2.54,8.1) 44(1.27,8.1)
  rect 2.2x0.6 smd: 7(-8.1,6.35) 8(-8.1,5.08) 9(-8.1,3.81) 10(-8.1,2.54) 11(-8.1,1.27) 12(-8.1,0) 13(-8.1,-1.27) 14(-8.1,-2.54) 15(-8.1,-3.81) 16(-8.1,-5.08) 17(-8.1,-6.35) 29(8.1,-6.35) 30(8.1,-5.08) 31(8.1,-3.81) 32(8.1,-2.54) 33(8.1,-1.27) 34(8.1,0) 35(8.1,1.27) 36(8.1,2.54) 37(8.1,3.81) 38(8.1,5.08) 39(8.1,6.35)
Mechanical 16:
  circle w0.61: c0,7.6 r0.3
  rectangle: -0.26,8.75 0.26,9.2
  rectangle: -1.53,8.75 -1.01,9.2
  rectangle: -2.8,8.75 -2.28,9.2
  rectangle: -4.07,8.75 -3.55,9.2
  rectangle: -5.34,8.75 -4.82,9.2
  rectangle: -6.61,8.75 -6.09,9.2
  rectangle: -9.2,6.09 -8.75,6.61
  rectangle: -9.2,4.82 -8.75,5.34
  rectangle: -9.2,3.55 -8.75,4.07
  rectangle: -9.2,2.28 -8.75,2.8
  rectangle: -9.2,1.01 -8.75,1.53
  rectangle: -9.2,-0.26 -8.75,0.26
  rectangle: -9.2,-1.53 -8.75,-1.01
  rectangle: -9.2,-2.8 -8.75,-2.28
  rectangle: -9.2,-4.07 -8.75,-3.55
  rectangle: -9.2,-5.34 -8.75,-4.82
  rectangle: -9.2,-6.61 -8.75,-6.09
  rectangle: -6.61,-9.2 -6.09,-8.75
  rectangle: -5.34,-9.2 -4.82,-8.75
  rectangle: -4.07,-9.2 -3.55,-8.75
  rectangle: -2.8,-9.2 -2.28,-8.75
  rectangle: -1.53,-9.2 -1.01,-8.75
  rectangle: -0.26,-9.2 0.26,-8.75
  rectangle: 1.01,-9.2 1.53,-8.75
  rectangle: 2.28,-9.2 2.8,-8.75
  rectangle: 3.55,-9.2 4.07,-8.75
  rectangle: 4.82,-9.2 5.34,-8.75
  rectangle: 6.09,-9.2 6.61,-8.75
  rectangle: 8.75,-6.61 9.2,-6.09
  rectangle: 8.75,-5.34 9.2,-4.82
  rectangle: 8.75,-4.07 9.2,-3.55
  rectangle: 8.75,-2.8 9.2,-2.28
  rectangle: 8.75,-1.53 9.2,-1.01
  rectangle: 8.75,-0.26 9.2,0.26
  rectangle: 8.75,1.01 9.2,1.53
  rectangle: 8.75,2.28 9.2,2.8
  rectangle: 8.75,3.55 9.2,4.07
  rectangle: 8.75,4.82 9.2,5.34
  rectangle: 8.75,6.09 9.2,6.61
  rectangle: 6.09,8.75 6.61,9.2
  rectangle: 4.82,8.75 5.34,9.2
  rectangle: 3.55,8.75 4.07,9.2
  rectangle: 2.28,8.75 2.8,9.2
  rectangle: 1.01,8.75 1.53,9.2
  lines w0.203: -8.7,-8.7 -8.7,6.465 -6.465,8.7 8.7,8.7 8.7,-8.7 -8.7,-8.7
Mechanical 27:
  lines w0.2: -9.903,-9.903 9.903,-9.903 9.903,9.903 -9.903,9.903 -9.903,-9.903

## PLCC52S [mm]
pads (52):
  rect 0.6x2.2 smd: 1(0,9.4) 2(-1.27,9.4) 3(-2.54,9.4) 4(-3.81,9.4) 5(-5.08,9.4) 6(-6.35,9.4) 7(-7.62,9.4) 21(-7.62,-9.4) 22(-6.35,-9.4) 23(-5.08,-9.4) 24(-3.81,-9.4) 25(-2.54,-9.4) 26(-1.27,-9.4) 27(0,-9.4) 28(1.27,-9.4) 29(2.54,-9.4) 30(3.81,-9.4) 31(5.08,-9.4) 32(6.35,-9.4) 33(7.62,-9.4) 47(7.62,9.4) 48(6.35,9.4) 49(5.08,9.4) 50(3.81,9.4) 51(2.54,9.4) 52(1.27,9.4)
  rect 2.2x0.6 smd: 8(-9.4,7.62) 9(-9.4,6.35) 10(-9.4,5.08) 11(-9.4,3.81) 12(-9.4,2.54) 13(-9.4,1.27) 14(-9.4,0) 15(-9.4,-1.27) 16(-9.4,-2.54) 17(-9.4,-3.81) 18(-9.4,-5.08) 19(-9.4,-6.35) 20(-9.4,-7.62) 34(9.4,-7.62) 35(9.4,-6.35) 36(9.4,-5.08) 37(9.4,-3.81) 38(9.4,-2.54) 39(9.4,-1.27) 40(9.4,0) 41(9.4,1.27) 42(9.4,2.54) 43(9.4,3.81) 44(9.4,5.08) 45(9.4,6.35) 46(9.4,7.62)
Mechanical 16:
  circle w0.61: c0,8.9 r0.3
  rectangle: -0.26,10.05 0.26,10.5
  rectangle: -1.53,10.05 -1.01,10.5
  rectangle: -2.8,10.05 -2.28,10.5
  rectangle: -4.07,10.05 -3.55,10.5
  rectangle: -5.34,10.05 -4.82,10.5
  rectangle: -6.61,10.05 -6.09,10.5
  rectangle: -7.88,10.05 -7.36,10.5
  rectangle: -10.5,7.36 -10.05,7.88
  rectangle: -10.5,6.09 -10.05,6.61
  rectangle: -10.5,4.82 -10.05,5.34
  rectangle: -10.5,3.55 -10.05,4.07
  rectangle: -10.5,2.28 -10.05,2.8
  rectangle: -10.5,1.01 -10.05,1.53
  rectangle: -10.5,-0.26 -10.05,0.26
  rectangle: -10.5,-1.53 -10.05,-1.01
  rectangle: -10.5,-2.8 -10.05,-2.28
  rectangle: -10.5,-4.07 -10.05,-3.55
  rectangle: -10.5,-5.34 -10.05,-4.82
  rectangle: -10.5,-6.61 -10.05,-6.09
  rectangle: -10.5,-7.88 -10.05,-7.36
  rectangle: -7.88,-10.5 -7.36,-10.05
  rectangle: -6.61,-10.5 -6.09,-10.05
  rectangle: -5.34,-10.5 -4.82,-10.05
  rectangle: -4.07,-10.5 -3.55,-10.05
  rectangle: -2.8,-10.5 -2.28,-10.05
  rectangle: -1.53,-10.5 -1.01,-10.05
  rectangle: -0.26,-10.5 0.26,-10.05
  rectangle: 1.01,-10.5 1.53,-10.05
  rectangle: 2.28,-10.5 2.8,-10.05
  rectangle: 3.55,-10.5 4.07,-10.05
  rectangle: 4.82,-10.5 5.34,-10.05
  rectangle: 6.09,-10.5 6.61,-10.05
  rectangle: 7.36,-10.5 7.88,-10.05
  rectangle: 10.05,-7.88 10.5,-7.36
  rectangle: 10.05,-6.61 10.5,-6.09
  rectangle: 10.05,-5.34 10.5,-4.82
  rectangle: 10.05,-4.07 10.5,-3.55
  rectangle: 10.05,-2.8 10.5,-2.28
  rectangle: 10.05,-1.53 10.5,-1.01
  rectangle: 10.05,-0.26 10.5,0.26
  rectangle: 10.05,1.01 10.5,1.53
  rectangle: 10.05,2.28 10.5,2.8
  rectangle: 10.05,3.55 10.5,4.07
  rectangle: 10.05,4.82 10.5,5.34
  rectangle: 10.05,6.09 10.5,6.61
  rectangle: 10.05,7.36 10.5,7.88
  rectangle: 7.36,10.05 7.88,10.5
  rectangle: 6.09,10.05 6.61,10.5
  rectangle: 4.82,10.05 5.34,10.5
  rectangle: 3.55,10.05 4.07,10.5
  rectangle: 2.28,10.05 2.8,10.5
  rectangle: 1.01,10.05 1.53,10.5
  lines w0.203: -10,-10 -10,7.765 -7.765,10 10,10 10,-10 -10,-10
Mechanical 27:
  lines w0.2: -10.903,-10.903 10.903,-10.903 10.903,10.903 -10.903,10.903 -10.903,-10.903

## PLCC68S [mil]
pads (68):
  rect 23.62x86.61 smd: 1(0,468.5) 2(-50,468.5) 3(-100,468.5) 4(-150,468.5) 5(-200,468.5) 6(-250,468.5) 7(-300,468.5) 8(-350,468.5) 9(-400,468.5) 27(-400,-468.5) 28(-350,-468.5) 29(-300,-468.5) 30(-250,-468.5) 31(-200,-468.5) 32(-150,-468.5) 33(-100,-468.5) 34(-50,-468.5) 35(0,-468.5) 36(50,-468.5) 37(100,-468.5) 38(150,-468.5) 39(200,-468.5) 40(250,-468.5) 41(300,-468.5) 42(350,-468.5) 43(400,-468.5) 61(400,468.5) 62(350,468.5) 63(300,468.5) 64(250,468.5) 65(200,468.5) 66(150,468.5) 67(100,468.5) 68(50,468.5)
  rect 86.61x23.62 smd: 10(-468.5,400) 11(-468.5,350) 12(-468.5,300) 13(-468.5,250) 14(-468.5,200) 15(-468.5,150) 16(-468.5,100) 17(-468.5,50) 18(-468.5,0) 19(-468.5,-50) 20(-468.5,-100) 21(-468.5,-150) 22(-468.5,-200) 23(-468.5,-250) 24(-468.5,-300) 25(-468.5,-350) 26(-468.5,-400) 44(468.5,-400) 45(468.5,-350) 46(468.5,-300) 47(468.5,-250) 48(468.5,-200) 49(468.5,-150) 50(468.5,-100) 51(468.5,-50) 52(468.5,0) 53(468.5,50) 54(468.5,100) 55(468.5,150) 56(468.5,200) 57(468.5,250) 58(468.5,300) 59(468.5,350) 60(468.5,400)
Mechanical 16:
  circle w24: c0,448.82 r11.81
  rectangle: -10.24,494.09 10.24,511.81
  rectangle: -60.24,494.09 -39.76,511.81
  rectangle: -110.24,494.09 -89.76,511.81
  rectangle: -160.24,494.09 -139.76,511.81
  rectangle: -210.24,494.09 -189.76,511.81
  rectangle: -260.24,494.09 -239.76,511.81
  rectangle: -310.24,494.09 -289.76,511.81
  rectangle: -360.24,494.09 -339.76,511.81
  rectangle: -410.24,494.09 -389.76,511.81
  rectangle: -511.81,389.76 -494.09,410.24
  rectangle: -511.81,339.76 -494.09,360.24
  rectangle: -511.81,289.76 -494.09,310.24
  rectangle: -511.81,239.76 -494.09,260.24
  rectangle: -511.81,189.76 -494.09,210.24
  rectangle: -511.81,139.76 -494.09,160.24
  rectangle: -511.81,89.76 -494.09,110.24
  rectangle: -511.81,39.76 -494.09,60.24
  rectangle: -511.81,-10.24 -494.09,10.24
  rectangle: -511.81,-60.24 -494.09,-39.76
  rectangle: -511.81,-110.24 -494.09,-89.76
  rectangle: -511.81,-160.24 -494.09,-139.76
  rectangle: -511.81,-210.24 -494.09,-189.76
  rectangle: -511.81,-260.24 -494.09,-239.76
  rectangle: -511.81,-310.24 -494.09,-289.76
  rectangle: -511.81,-360.24 -494.09,-339.76
  rectangle: -511.81,-410.24 -494.09,-389.76
  rectangle: -410.24,-511.81 -389.76,-494.09
  rectangle: -360.24,-511.81 -339.76,-494.09
  rectangle: -310.24,-511.81 -289.76,-494.09
  rectangle: -260.24,-511.81 -239.76,-494.09
  rectangle: -210.24,-511.81 -189.76,-494.09
  rectangle: -160.24,-511.81 -139.76,-494.09
  rectangle: -110.24,-511.81 -89.76,-494.09
  rectangle: -60.24,-511.81 -39.76,-494.09
  rectangle: -10.24,-511.81 10.24,-494.09
  rectangle: 39.76,-511.81 60.24,-494.09
  rectangle: 89.76,-511.81 110.24,-494.09
  rectangle: 139.76,-511.81 160.24,-494.09
  rectangle: 189.76,-511.81 210.24,-494.09
  rectangle: 239.76,-511.81 260.24,-494.09
  rectangle: 289.76,-511.81 310.24,-494.09
  rectangle: 339.76,-511.81 360.24,-494.09
  rectangle: 389.76,-511.81 410.24,-494.09
  rectangle: 494.09,-410.24 511.81,-389.76
  rectangle: 494.09,-360.24 511.81,-339.76
  rectangle: 494.09,-310.24 511.81,-289.76
  rectangle: 494.09,-260.24 511.81,-239.76
  rectangle: 494.09,-210.24 511.81,-189.76
  rectangle: 494.09,-160.24 511.81,-139.76
  rectangle: 494.09,-110.24 511.81,-89.76
  rectangle: 494.09,-60.24 511.81,-39.76
  rectangle: 494.09,-10.24 511.81,10.24
  rectangle: 494.09,39.76 511.81,60.24
  rectangle: 494.09,89.76 511.81,110.24
  rectangle: 494.09,139.76 511.81,160.24
  rectangle: 494.09,189.76 511.81,210.24
  rectangle: 494.09,239.76 511.81,260.24
  rectangle: 494.09,289.76 511.81,310.24
  rectangle: 494.09,339.76 511.81,360.24
  rectangle: 494.09,389.76 511.81,410.24
  rectangle: 389.76,494.09 410.24,511.81
  rectangle: 339.76,494.09 360.24,511.81
  rectangle: 289.76,494.09 310.24,511.81
  rectangle: 239.76,494.09 260.24,511.81
  rectangle: 189.76,494.09 210.24,511.81
  rectangle: 139.76,494.09 160.24,511.81
  rectangle: 89.76,494.09 110.24,511.81
  rectangle: 39.76,494.09 60.24,511.81
  lines w8: -492.13,-492.13 -492.13,404.13 -404.13,492.13 492.13,492.13 492.13,-492.13 -492.13,-492.13
Mechanical 27:
  lines w7.87: -527.68,-527.68 527.68,-527.68 527.68,527.68 -527.68,527.68 -527.68,-527.68

## PLCC84S [mm]
pads (84):
  rect 0.6x2.2 smd: 1(0,14.5) 2(-1.27,14.5) 3(-2.54,14.5) 4(-3.81,14.5) 5(-5.08,14.5) 6(-6.35,14.5) 7(-7.62,14.5) 8(-8.89,14.5) 9(-10.16,14.5) 10(-11.43,14.5) 11(-12.7,14.5) 33(-12.7,-14.5) 34(-11.43,-14.5) 35(-10.16,-14.5) 36(-8.89,-14.5) 37(-7.62,-14.5) 38(-6.35,-14.5) 39(-5.08,-14.5) 40(-3.81,-14.5) 41(-2.54,-14.5) 42(-1.27,-14.5) 43(0,-14.5) 44(1.27,-14.5) 45(2.54,-14.5) 46(3.81,-14.5) 47(5.08,-14.5) 48(6.35,-14.5) 49(7.62,-14.5) 50(8.89,-14.5) 51(10.16,-14.5) 52(11.43,-14.5) 53(12.7,-14.5) 75(12.7,14.5) 76(11.43,14.5) 77(10.16,14.5) 78(8.89,14.5) 79(7.62,14.5) 80(6.35,14.5) 81(5.08,14.5) 82(3.81,14.5) 83(2.54,14.5) 84(1.27,14.5)
  rect 2.2x0.6 smd: 12(-14.5,12.7) 13(-14.5,11.43) 14(-14.5,10.16) 15(-14.5,8.89) 16(-14.5,7.62) 17(-14.5,6.35) 18(-14.5,5.08) 19(-14.5,3.81) 20(-14.5,2.54) 21(-14.5,1.27) 22(-14.5,0) 23(-14.5,-1.27) 24(-14.5,-2.54) 25(-14.5,-3.81) 26(-14.5,-5.08) 27(-14.5,-6.35) 28(-14.5,-7.62) 29(-14.5,-8.89) 30(-14.5,-10.16) 31(-14.5,-11.43) 32(-14.5,-12.7) 54(14.5,-12.7) 55(14.5,-11.43) 56(14.5,-10.16) 57(14.5,-8.89) 58(14.5,-7.62) 59(14.5,-6.35) 60(14.5,-5.08) 61(14.5,-3.81) 62(14.5,-2.54) 63(14.5,-1.27) 64(14.5,0) 65(14.5,1.27) 66(14.5,2.54) 67(14.5,3.81) 68(14.5,5.08) 69(14.5,6.35) 70(14.5,7.62) 71(14.5,8.89) 72(14.5,10.16) 73(14.5,11.43) 74(14.5,12.7)
Mechanical 16:
  circle w0.61: c0,14 r0.3
  rectangle: -0.26,15.15 0.26,15.6
  rectangle: -1.53,15.15 -1.01,15.6
  rectangle: -2.8,15.15 -2.28,15.6
  rectangle: -4.07,15.15 -3.55,15.6
  rectangle: -5.34,15.15 -4.82,15.6
  rectangle: -6.61,15.15 -6.09,15.6
  rectangle: -7.88,15.15 -7.36,15.6
  rectangle: -9.15,15.15 -8.63,15.6
  rectangle: -10.42,15.15 -9.9,15.6
  rectangle: -11.69,15.15 -11.17,15.6
  rectangle: -12.96,15.15 -12.44,15.6
  rectangle: -15.6,12.44 -15.15,12.96
  rectangle: -15.6,11.17 -15.15,11.69
  rectangle: -15.6,9.9 -15.15,10.42
  rectangle: -15.6,8.63 -15.15,9.15
  rectangle: -15.6,7.36 -15.15,7.88
  rectangle: -15.6,6.09 -15.15,6.61
  rectangle: -15.6,4.82 -15.15,5.34
  rectangle: -15.6,3.55 -15.15,4.07
  rectangle: -15.6,2.28 -15.15,2.8
  rectangle: -15.6,1.01 -15.15,1.53
  rectangle: -15.6,-0.26 -15.15,0.26
  rectangle: -15.6,-1.53 -15.15,-1.01
  rectangle: -15.6,-2.8 -15.15,-2.28
  rectangle: -15.6,-4.07 -15.15,-3.55
  rectangle: -15.6,-5.34 -15.15,-4.82
  rectangle: -15.6,-6.61 -15.15,-6.09
  rectangle: -15.6,-7.88 -15.15,-7.36
  rectangle: -15.6,-9.15 -15.15,-8.63
  rectangle: -15.6,-10.42 -15.15,-9.9
  rectangle: -15.6,-11.69 -15.15,-11.17
  rectangle: -15.6,-12.96 -15.15,-12.44
  rectangle: -12.96,-15.6 -12.44,-15.15
  rectangle: -11.69,-15.6 -11.17,-15.15
  rectangle: -10.42,-15.6 -9.9,-15.15
  rectangle: -9.15,-15.6 -8.63,-15.15
  rectangle: -7.88,-15.6 -7.36,-15.15
  rectangle: -6.61,-15.6 -6.09,-15.15
  rectangle: -5.34,-15.6 -4.82,-15.15
  rectangle: -4.07,-15.6 -3.55,-15.15
  rectangle: -2.8,-15.6 -2.28,-15.15
  rectangle: -1.53,-15.6 -1.01,-15.15
  rectangle: -0.26,-15.6 0.26,-15.15
  rectangle: 1.01,-15.6 1.53,-15.15
  rectangle: 2.28,-15.6 2.8,-15.15
  rectangle: 3.55,-15.6 4.07,-15.15
  rectangle: 4.82,-15.6 5.34,-15.15
  rectangle: 6.09,-15.6 6.61,-15.15
  rectangle: 7.36,-15.6 7.88,-15.15
  rectangle: 8.63,-15.6 9.15,-15.15
  rectangle: 9.9,-15.6 10.42,-15.15
  rectangle: 11.17,-15.6 11.69,-15.15
  rectangle: 12.44,-15.6 12.96,-15.15
  rectangle: 15.15,-12.96 15.6,-12.44
  rectangle: 15.15,-11.69 15.6,-11.17
  rectangle: 15.15,-10.42 15.6,-9.9
  rectangle: 15.15,-9.15 15.6,-8.63
  rectangle: 15.15,-7.88 15.6,-7.36
  rectangle: 15.15,-6.61 15.6,-6.09
  rectangle: 15.15,-5.34 15.6,-4.82
  rectangle: 15.15,-4.07 15.6,-3.55
  rectangle: 15.15,-2.8 15.6,-2.28
  rectangle: 15.15,-1.53 15.6,-1.01
  rectangle: 15.15,-0.26 15.6,0.26
  rectangle: 15.15,1.01 15.6,1.53
  rectangle: 15.15,2.28 15.6,2.8
  rectangle: 15.15,3.55 15.6,4.07
  rectangle: 15.15,4.82 15.6,5.34
  rectangle: 15.15,6.09 15.6,6.61
  rectangle: 15.15,7.36 15.6,7.88
  rectangle: 15.15,8.63 15.6,9.15
  rectangle: 15.15,9.9 15.6,10.42
  rectangle: 15.15,11.17 15.6,11.69
  rectangle: 15.15,12.44 15.6,12.96
  rectangle: 12.44,15.15 12.96,15.6
  rectangle: 11.17,15.15 11.69,15.6
  rectangle: 9.9,15.15 10.42,15.6
  rectangle: 8.63,15.15 9.15,15.6
  rectangle: 7.36,15.15 7.88,15.6
  rectangle: 6.09,15.15 6.61,15.6
  rectangle: 4.82,15.15 5.34,15.6
  rectangle: 3.55,15.15 4.07,15.6
  rectangle: 2.28,15.15 2.8,15.6
  rectangle: 1.01,15.15 1.53,15.6
  lines w0.203: -15.1,-15.1 -15.1,12.865 -12.865,15.1 15.1,15.1 15.1,-15.1 -15.1,-15.1
Mechanical 27:
  lines w0.2: -16.403,-16.403 16.403,-16.403 16.403,16.403 -16.403,16.403 -16.403,-16.403

## PLCC100S [mm]
pads (100):
  rect 0.6x2.2 smd: 1(0,17) 2(-1.27,17) 3(-2.54,17) 4(-3.81,17) 5(-5.08,17) 6(-6.35,17) 7(-7.62,17) 8(-8.89,17) 9(-10.16,17) 10(-11.43,17) 11(-12.7,17) 12(-13.97,17) 13(-15.24,17) 39(-15.24,-17) 40(-13.97,-17) 41(-12.7,-17) 42(-11.43,-17) 43(-10.16,-17) 44(-8.89,-17) 45(-7.62,-17) 46(-6.35,-17) 47(-5.08,-17) 48(-3.81,-17) 49(-2.54,-17) 50(-1.27,-17) 51(0,-17) 52(1.27,-17) 53(2.54,-17) 54(3.81,-17) 55(5.08,-17) 56(6.35,-17) 57(7.62,-17) 58(8.89,-17) 59(10.16,-17) 60(11.43,-17) 61(12.7,-17) 62(13.97,-17) 63(15.24,-17) 89(15.24,17) 90(13.97,17) 91(12.7,17) 92(11.43,17) 93(10.16,17) 94(8.89,17) 95(7.62,17) 96(6.35,17) 97(5.08,17) 98(3.81,17) 99(2.54,17) 100(1.27,17)
  rect 2.2x0.6 smd: 14(-17,15.24) 15(-17,13.97) 16(-17,12.7) 17(-17,11.43) 18(-17,10.16) 19(-17,8.89) 20(-17,7.62) 21(-17,6.35) 22(-17,5.08) 23(-17,3.81) 24(-17,2.54) 25(-17,1.27) 26(-17,0) 27(-17,-1.27) 28(-17,-2.54) 29(-17,-3.81) 30(-17,-5.08) 31(-17,-6.35) 32(-17,-7.62) 33(-17,-8.89) 34(-17,-10.16) 35(-17,-11.43) 36(-17,-12.7) 37(-17,-13.97) 38(-17,-15.24) 64(17,-15.24) 65(17,-13.97) 66(17,-12.7) 67(17,-11.43) 68(17,-10.16) 69(17,-8.89) 70(17,-7.62) 71(17,-6.35) 72(17,-5.08) 73(17,-3.81) 74(17,-2.54) 75(17,-1.27) 76(17,0) 77(17,1.27) 78(17,2.54) 79(17,3.81) 80(17,5.08) 81(17,6.35) 82(17,7.62) 83(17,8.89) 84(17,10.16) 85(17,11.43) 86(17,12.7) 87(17,13.97) 88(17,15.24)
Mechanical 16:
  circle w0.61: c0,16.5 r0.3
  rectangle: -0.26,17.65 0.26,18.1
  rectangle: -1.53,17.65 -1.01,18.1
  rectangle: -2.8,17.65 -2.28,18.1
  rectangle: -4.07,17.65 -3.55,18.1
  rectangle: -5.34,17.65 -4.82,18.1
  rectangle: -6.61,17.65 -6.09,18.1
  rectangle: -7.88,17.65 -7.36,18.1
  rectangle: -9.15,17.65 -8.63,18.1
  rectangle: -10.42,17.65 -9.9,18.1
  rectangle: -11.69,17.65 -11.17,18.1
  rectangle: -12.96,17.65 -12.44,18.1
  rectangle: -14.23,17.65 -13.71,18.1
  rectangle: -15.5,17.65 -14.98,18.1
  rectangle: -18.1,14.98 -17.65,15.5
  rectangle: -18.1,13.71 -17.65,14.23
  rectangle: -18.1,12.44 -17.65,12.96
  rectangle: -18.1,11.17 -17.65,11.69
  rectangle: -18.1,9.9 -17.65,10.42
  rectangle: -18.1,8.63 -17.65,9.15
  rectangle: -18.1,7.36 -17.65,7.88
  rectangle: -18.1,6.09 -17.65,6.61
  rectangle: -18.1,4.82 -17.65,5.34
  rectangle: -18.1,3.55 -17.65,4.07
  rectangle: -18.1,2.28 -17.65,2.8
  rectangle: -18.1,1.01 -17.65,1.53
  rectangle: -18.1,-0.26 -17.65,0.26
  rectangle: -18.1,-1.53 -17.65,-1.01
  rectangle: -18.1,-2.8 -17.65,-2.28
  rectangle: -18.1,-4.07 -17.65,-3.55
  rectangle: -18.1,-5.34 -17.65,-4.82
  rectangle: -18.1,-6.61 -17.65,-6.09
  rectangle: -18.1,-7.88 -17.65,-7.36
  rectangle: -18.1,-9.15 -17.65,-8.63
  rectangle: -18.1,-10.42 -17.65,-9.9
  rectangle: -18.1,-11.69 -17.65,-11.17
  rectangle: -18.1,-12.96 -17.65,-12.44
  rectangle: -18.1,-14.23 -17.65,-13.71
  rectangle: -18.1,-15.5 -17.65,-14.98
  rectangle: -15.5,-18.1 -14.98,-17.65
  rectangle: -14.23,-18.1 -13.71,-17.65
  rectangle: -12.96,-18.1 -12.44,-17.65
  rectangle: -11.69,-18.1 -11.17,-17.65
  rectangle: -10.42,-18.1 -9.9,-17.65
  rectangle: -9.15,-18.1 -8.63,-17.65
  rectangle: -7.88,-18.1 -7.36,-17.65
  rectangle: -6.61,-18.1 -6.09,-17.65
  rectangle: -5.34,-18.1 -4.82,-17.65
  rectangle: -4.07,-18.1 -3.55,-17.65
  rectangle: -2.8,-18.1 -2.28,-17.65
  rectangle: -1.53,-18.1 -1.01,-17.65
  rectangle: -0.26,-18.1 0.26,-17.65
  rectangle: 1.01,-18.1 1.53,-17.65
  rectangle: 2.28,-18.1 2.8,-17.65
  rectangle: 3.55,-18.1 4.07,-17.65
  rectangle: 4.82,-18.1 5.34,-17.65
  rectangle: 6.09,-18.1 6.61,-17.65
  rectangle: 7.36,-18.1 7.88,-17.65
  rectangle: 8.63,-18.1 9.15,-17.65
  rectangle: 9.9,-18.1 10.42,-17.65
  rectangle: 11.17,-18.1 11.69,-17.65
  rectangle: 12.44,-18.1 12.96,-17.65
  rectangle: 13.71,-18.1 14.23,-17.65
  rectangle: 14.98,-18.1 15.5,-17.65
  rectangle: 17.65,-15.5 18.1,-14.98
  rectangle: 17.65,-14.23 18.1,-13.71
  rectangle: 17.65,-12.96 18.1,-12.44
  rectangle: 17.65,-11.69 18.1,-11.17
  rectangle: 17.65,-10.42 18.1,-9.9
  rectangle: 17.65,-9.15 18.1,-8.63
  rectangle: 17.65,-7.88 18.1,-7.36
  rectangle: 17.65,-6.61 18.1,-6.09
  rectangle: 17.65,-5.34 18.1,-4.82
  rectangle: 17.65,-4.07 18.1,-3.55
  rectangle: 17.65,-2.8 18.1,-2.28
  rectangle: 17.65,-1.53 18.1,-1.01
  rectangle: 17.65,-0.26 18.1,0.26
  rectangle: 17.65,1.01 18.1,1.53
  rectangle: 17.65,2.28 18.1,2.8
  rectangle: 17.65,3.55 18.1,4.07
  rectangle: 17.65,4.82 18.1,5.34
  rectangle: 17.65,6.09 18.1,6.61
  rectangle: 17.65,7.36 18.1,7.88
  rectangle: 17.65,8.63 18.1,9.15
  rectangle: 17.65,9.9 18.1,10.42
  rectangle: 17.65,11.17 18.1,11.69
  rectangle: 17.65,12.44 18.1,12.96
  rectangle: 17.65,13.71 18.1,14.23
  rectangle: 17.65,14.98 18.1,15.5
  rectangle: 14.98,17.65 15.5,18.1
  rectangle: 13.71,17.65 14.23,18.1
  rectangle: 12.44,17.65 12.96,18.1
  rectangle: 11.17,17.65 11.69,18.1
  rectangle: 9.9,17.65 10.42,18.1
  rectangle: 8.63,17.65 9.15,18.1
  rectangle: 7.36,17.65 7.88,18.1
  rectangle: 6.09,17.65 6.61,18.1
  rectangle: 4.82,17.65 5.34,18.1
  rectangle: 3.55,17.65 4.07,18.1
  rectangle: 2.28,17.65 2.8,18.1
  rectangle: 1.01,17.65 1.53,18.1
  lines w0.203: -17.6,-17.6 -17.6,15.365 -15.365,17.6 17.6,17.6 17.6,-17.6 -17.6,-17.6
Mechanical 27:
  lines w0.2: -19.403,-19.403 19.403,-19.403 19.403,19.403 -19.403,19.403 -19.403,-19.403